# Altium schematic symbol library 常用元件库.SchLib: 1827 symbols (part 10 of 10)
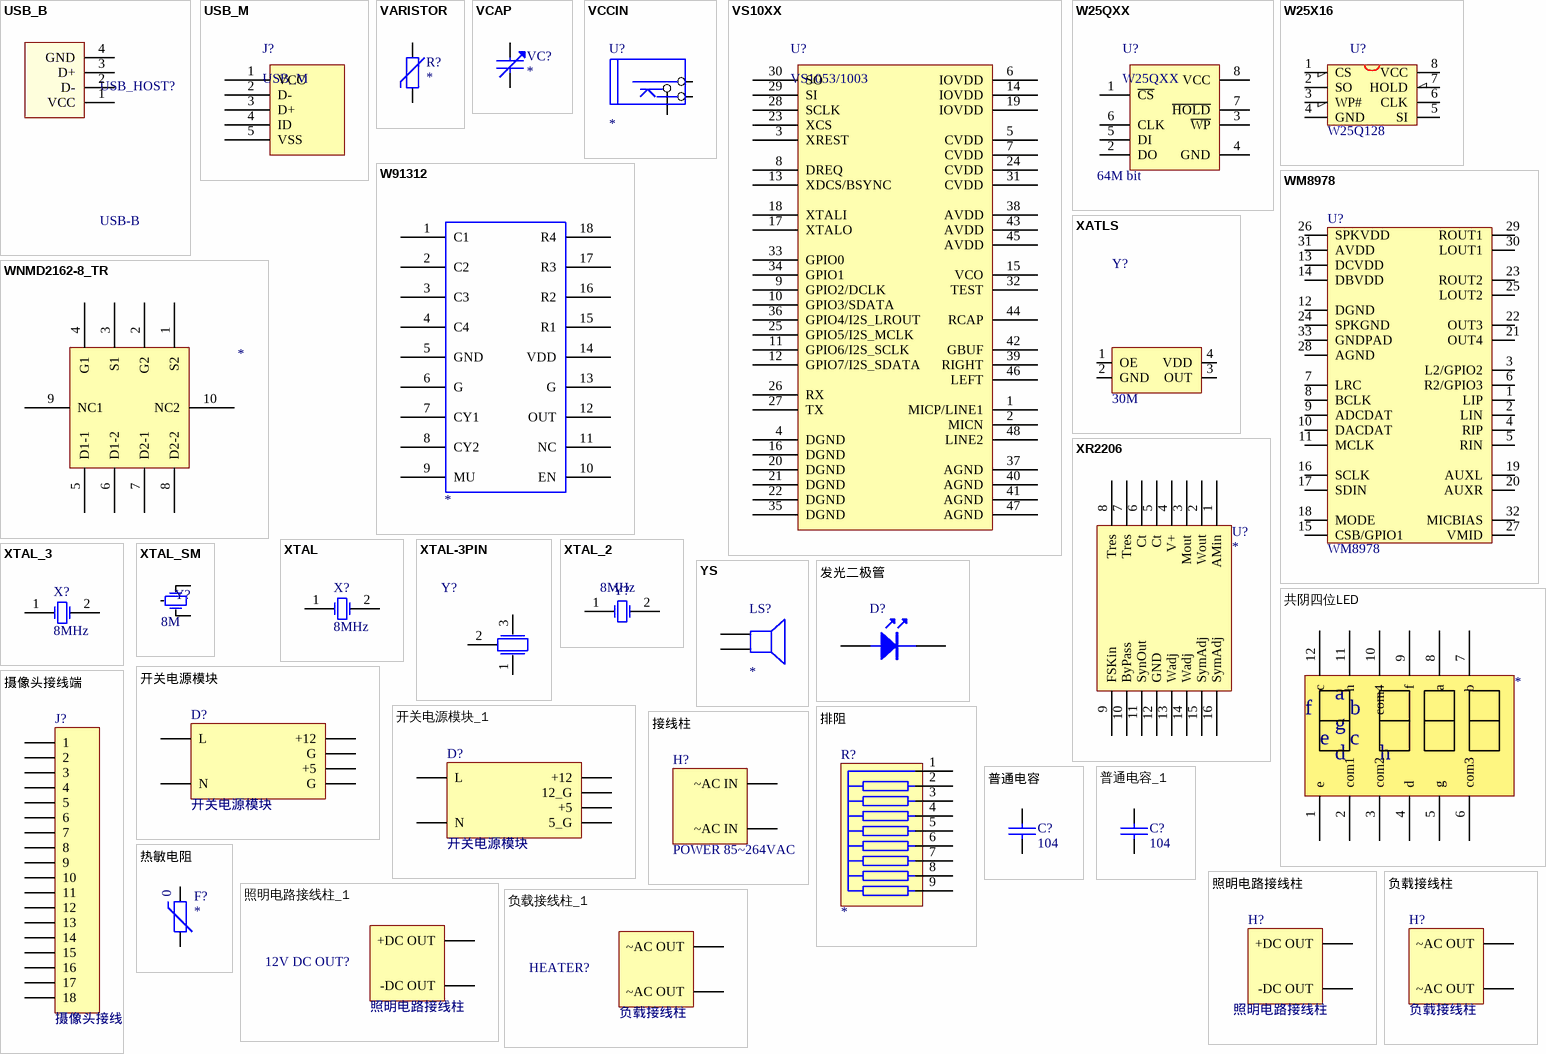
[diagram p84: symbols USB_B to 负载接线柱_1]

## XTAL
designator X?, comment 8MHz
Crystal Oscillator; Published: 8-Jun-2000; LatestRevisionDate: 17-Jul-2002; LatestRevisionNote: Re-released for DXP Platform.; Publisher: Altium Limited
footprint XTAL_US
pins: 1 OSC1, 2 OSC2

## XTAL-3PIN
designator Y?  (value not drawn)
贴片晶振
footprint X-CPX20 (贴片晶振)
pins: 1, 2, 3

## XTAL_2
designator Y?, comment 8MHz
Crystal Oscillator; Published: 8-Jun-2000; LatestRevisionDate: 17-Jul-2002; LatestRevisionNote: Re-released for DXP Platform.; Publisher: Altium Limited
footprint XTAL_US
pins: 1 OSC1, 2 OSC2

## XTAL_3
designator X?, comment 8MHz
Crystal Oscillator; Published: 8-Jun-2000; LatestRevisionDate: 17-Jul-2002; LatestRevisionNote: Re-released for DXP Platform.; Publisher: Altium Limited
footprint XTAL-SIP1
simulation model XTAL (Spice Subcircuit)
pins: 1 OSC1, 2 OSC2

## XTAL_SM
designator Y?  value 8M  (hidden comment: XTAL_SM)
圆柱晶振; Published: 8-Jun-2000; LatestRevisionDate: 17-Jul-2002; LatestRevisionNote: Re-released for DXP Platform.; PackageReference: R38; Publisher: Altium Limited
footprint X-TC15 (圆柱晶振1)
footprint X-TC26 (圆柱晶振2)
pins: 1 OSC1, 2 OSC2, 3

## YS
designator LS?
pins: 1, 2

## 共阴四位LED
designator ?
footprint LDS-5461BH
pins: 1 e, 2 com1, 3 com2, 4 d, 5 g, 6 com3, 7 b, 8 a, 9 f, 10 com4, 11 h, 12 c

## 发光二极管
designator D?
footprint 0805
pins: A 1, K 2

## 开关电源模块
designator D?
footprint 12V1A/5V1A
pins: 5V +5, 12V +12, GND G, GND G, L "火线", N "零线"

## 开关电源模块_1
designator D?, comment 开关电源模块
footprint 12V1A/5V1A
pins: 5_G, 12_G, +5V +5, +12V +12, L "火线", N "零线"

## 排阻
designator R?
footprint sip9
pins: 1, 2, 3, 4, 5, 6, 7, 8, 9

## 接线柱
designator H?, comment POWER 85~264VAC
85~264VAC
footprint KF8500-2P
pins: 1 ~AC IN, 2 ~AC IN

## 摄像头接线端
designator J?
Header, 16-Pin; LatestRevisionDate: 17-Jul-2002; LatestRevisionNote: Re-released for DXP Platform.; Publisher: Altium Limited
footprint fpc18p_0.5
pins: 1, 2, 3, 4, 5, 6, 7, 8, 9, 10, 11, 12, 13, 14, 15, 16, 17, 18

## 普通电容
designator C?, comment 104
Capacitor
footprint 0805
footprint RAD0.2
footprint RAD0.3
pins: 1, 2

## 普通电容_1
designator C?, comment 104
Capacitor
footprint 0805
footprint RAD0.2
footprint RAD0.3
footprint C0805
pins: 1, 2

## 热敏电阻
designator F?
footprint AXIAL0.4
pins: 1, 2
text: 0

## 照明电路接线柱
designator H?
12V控制输出
pins: 1 +DC OUT, 2 -DC OUT

## 照明电路接线柱_1
designator 12V DC OUT?, comment 照明电路接线柱
12V控制输出
footprint KF8500-2P
pins: 1 +DC OUT, 2 -DC OUT

## 负载接线柱
designator H?
footprint KF8500-2P
pins: 1 ~AC OUT, 2 ~AC OUT

## 负载接线柱_1
designator HEATER?, comment 负载接线柱
footprint KF8500-2P
pins: 1 ~AC OUT, 2 ~AC OUT